# Altium footprint library BWRC.PcbLib: 51 footprints (part 3 of 4)
Each footprint in its own frame and in the unit in brackets; x right, y up, seen from the top. Pads: shape width x height; smd on the part's side, far side on the other; paste and mask are expansions set on the pad; w line width, h text height; cw(c..) or ccw(c..) is an arc to the next point about the centre after c.
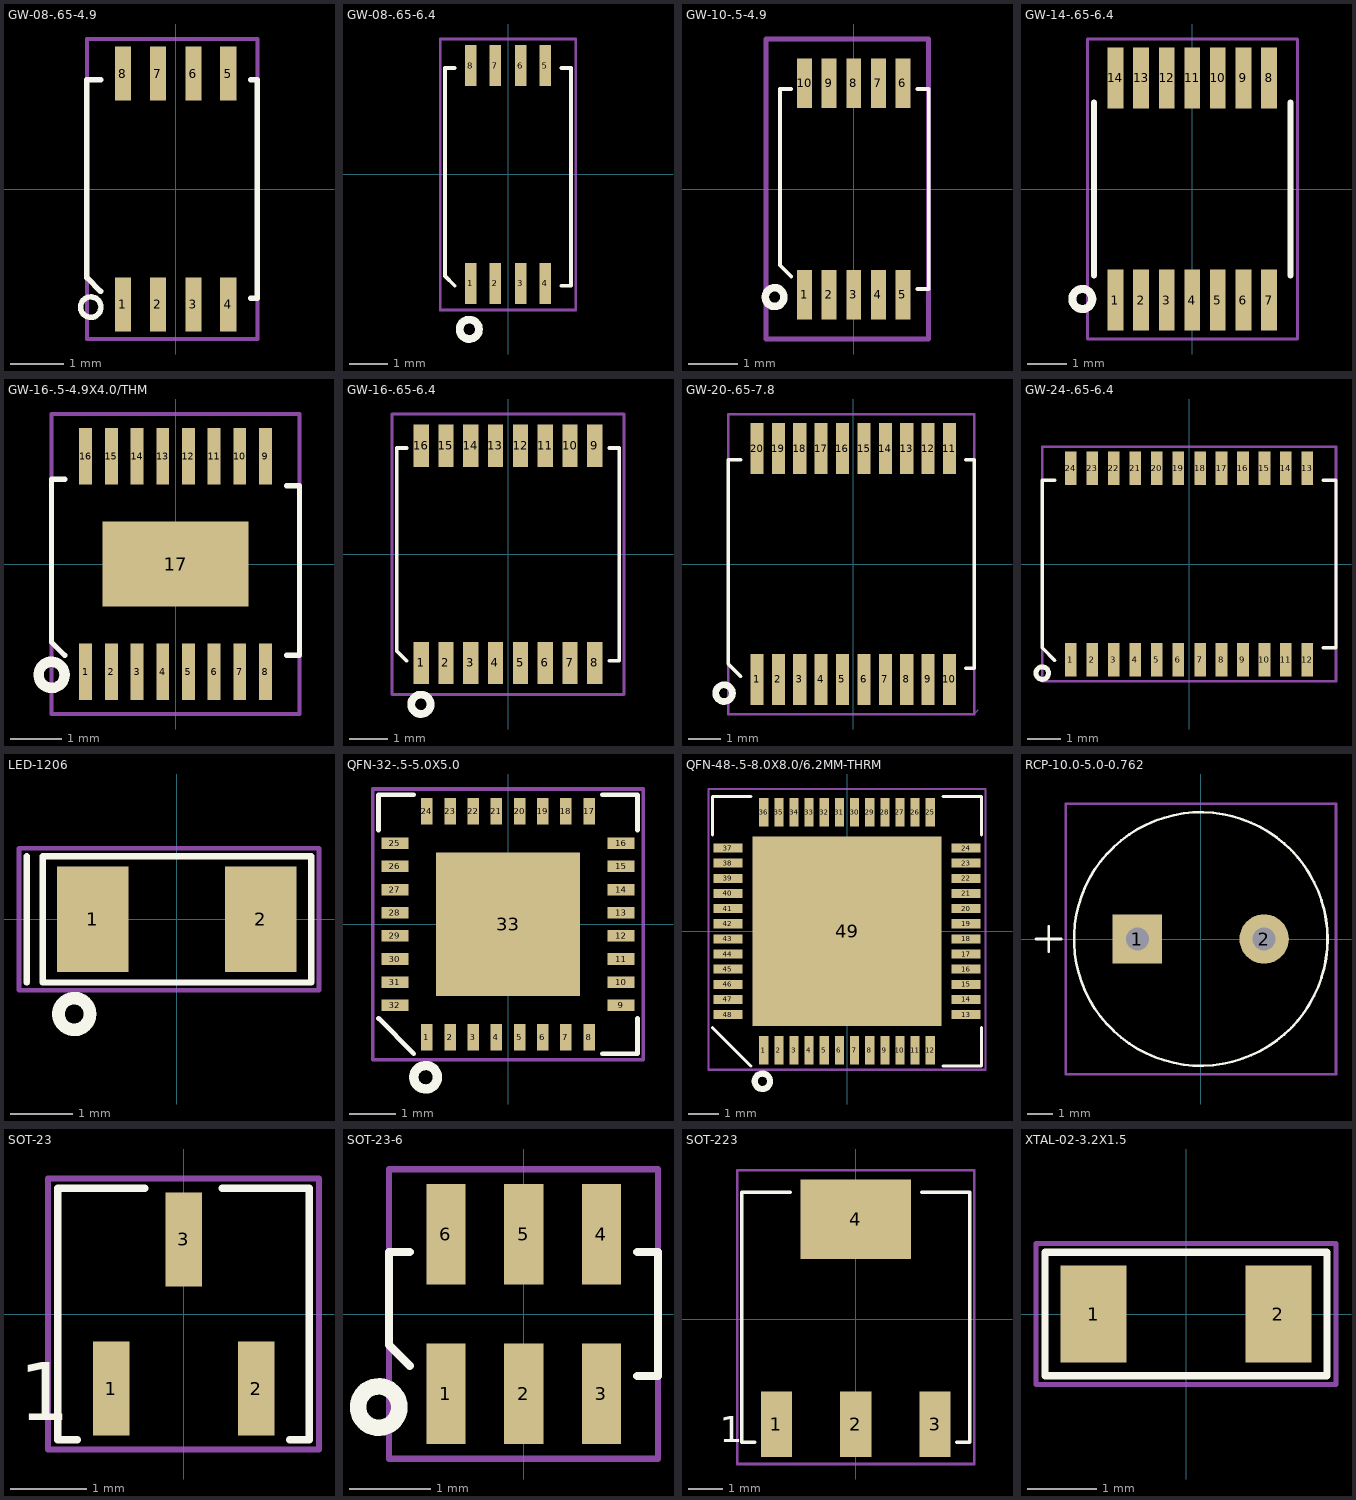
[diagram p2: the footprints below, top view; thin cyan lines are the x and y axes]

## GW-08-.65-4.9 [mm]
pads (8):
  rect 0.3x1.01 smd: 1(-0.98,-2.15) 2(-0.33,-2.15) 3(0.33,-2.15) 4(0.98,-2.15) 5(0.98,2.15) 6(0.33,2.15) 7(-0.33,2.15) 8(-0.98,2.15)
Top Overlay:
  circle w0.102: c-1.58,-2.2 r0.19
  lines w0.102: -1.397,-1.905 -1.651,-1.651 -1.651,2.032 -1.397,2.032 ; 1.397,-2.032 1.524,-2.032 1.524,2.032 1.397,2.032
M15_Courtyard_Top:
  lines w0.076: -1.651,-2.794 -1.651,2.794 1.524,2.794 1.524,-2.794 -1.651,-2.794

## GW-08-.65-6.4 [mm]
pads (8):
  rect 0.3x1.08 smd: 1(-0.98,-2.86) 2(-0.33,-2.86) 3(0.33,-2.86) 4(0.98,-2.86) 5(0.98,2.86) 6(0.33,2.86) 7(-0.33,2.86) 8(-0.98,2.86)
Top Overlay:
  circle w0.203: c-1.016,-4.064 r0.254
  lines w0.102: -1.397,-2.921 -1.651,-2.667 -1.651,2.794 -1.397,2.794 ; 1.397,-2.921 1.651,-2.921 1.651,2.794 1.397,2.794
M15_Courtyard_Top:
  lines w0.076: -1.778,-3.556 1.778,-3.556 1.778,3.556 -1.778,3.556 -1.778,-3.556

## GW-10-.5-4.9 [mm]
pads (10):
  rect 0.304x1.008 smd: 1(-1,-2.146) 2(-0.5,-2.146) 3(0,-2.146) 4(0.5,-2.146) 5(1,-2.146) 6(1,2.146) 7(0.5,2.146) 8(0,2.146) 9(-0.5,2.146) 10(-1,2.146)
Top Overlay:
  circle w0.152: c-1.608,-2.196 r0.19
  lines w0.076: -1.27,-1.778 -1.5,-1.548 -1.5,-1.5 -1.5,2.032 -1.27,2.032 ; 1.295,-2.032 1.524,-2.032 1.524,2.032 1.295,2.032
M15_Courtyard_Top:
  lines w0.102: -1.778,-3.048 -1.778,3.048 1.524,3.048 1.524,-3.048 -1.778,-3.048

## GW-14-.65-6.4 [mm]
pads (14):
  rect 0.4x1.56 smd: 1(-1.95,-2.82) 2(-1.3,-2.82) 3(-0.65,-2.82) 4(0,-2.82) 5(0.65,-2.82) 6(1.3,-2.82) 7(1.95,-2.82) 8(1.95,2.82) 9(1.3,2.82) 10(0.65,2.82) 11(0,2.82) 12(-0.65,2.82) 13(-1.3,2.82) 14(-1.95,2.82)
Top Overlay:
  circle w0.203: c-2.794,-2.794 r0.254
  lines w0.15: -2.5,-2.2 -2.5,2.2 ; 2.5,-2.2 2.5,2.2
M15_Courtyard_Top:
  lines w0.076: -2.667,-3.81 -2.667,3.81 2.667,3.81 2.667,-3.81 -2.667,-3.81

## GW-16-.5-4.9X4.0/THM [mm]
pads (17):
  rect 0.25x1.1 smd: 1(-1.75,-2.1) 2(-1.25,-2.1) 3(-0.75,-2.1) 4(-0.25,-2.1) 5(0.25,-2.1) 6(0.75,-2.1) 7(1.25,-2.1) 8(1.75,-2.1) 9(1.75,2.1) 10(1.25,2.1) 11(0.75,2.1) 12(0.25,2.1) 13(-0.25,2.1) 14(-0.75,2.1) 15(-1.25,2.1) 16(-1.75,2.1)
  rect 2.85x1.65 smd: 17(0,0)
Top Overlay:
  circle w0.203: c-2.413,-2.159 r0.254
  lines w0.102: -2.159,-1.778 -2.413,-1.524 -2.413,1.651 -2.159,1.651 ; 2.159,-1.778 2.413,-1.778 2.413,1.524 2.159,1.524
M15_Courtyard_Top:
  lines w0.076: -2.413,-2.921 2.413,-2.921 2.413,-1.778 2.413,2.921 -2.413,2.921 -2.413,-2.921

## GW-16-.65-6.4 [mm]
pads (16):
  rect 0.4x1.11 smd: 1(-2.28,-2.85) 2(-1.63,-2.85) 3(-0.98,-2.85) 4(-0.33,-2.85) 5(0.33,-2.85) 6(0.98,-2.85) 7(1.63,-2.85) 8(2.28,-2.85) 9(2.28,2.85) 10(1.63,2.85) 11(0.98,2.85) 12(0.33,2.85) 13(-0.33,2.85) 14(-0.98,2.85) 15(-1.63,2.85) 16(-2.28,2.85)
Top Overlay:
  circle w0.203: c-2.286,-3.937 r0.254
  lines w0.102: -2.667,-2.794 -2.921,-2.54 -2.921,2.794 -2.667,2.794 ; 2.667,-2.794 2.921,-2.794 2.921,2.794 2.667,2.794
M15_Courtyard_Top:
  lines w0.076: -3.048,-3.683 -3.048,3.683 3.048,3.683 3.048,-3.683 -3.048,-3.683

## GW-20-.65-7.8 [mm]
pads (20):
  rect 0.4x1.56 smd: 1(-2.93,-3.52) 2(-2.28,-3.52) 3(-1.63,-3.52) 4(-0.98,-3.52) 5(-0.33,-3.52) 6(0.33,-3.52) 7(0.98,-3.52) 8(1.63,-3.52) 9(2.28,-3.52) 10(2.93,-3.52) 11(2.93,3.52) 12(2.28,3.52) 13(1.63,3.52) 14(0.98,3.52) 15(0.33,3.52) 16(-0.33,3.52) 17(-0.98,3.52) 18(-1.63,3.52) 19(-2.28,3.52) 20(-2.93,3.52)
Top Overlay:
  circle w0.203: c-3.937,-3.937 r0.254
  lines w0.102: -3.429,-3.429 -3.81,-3.048 -3.81,3.175 -3.429,3.175 ; 3.429,-3.175 3.683,-3.175 3.683,3.175 3.429,3.175
M15_Courtyard_Top:
  lines w0: 3.683,-4.572 3.81,-4.445
  lines w0.076: -3.81,-4.572 3.683,-4.572 3.683,4.572 -3.81,4.572 -3.81,-4.572

## GW-24-.65-6.4 [mm]
pads (24):
  rect 0.35x1.01 smd: 1(-3.58,-2.9) 2(-2.93,-2.9) 3(-2.28,-2.9) 4(-1.63,-2.9) 5(-0.98,-2.9) 6(-0.33,-2.9) 7(0.33,-2.9) 8(0.98,-2.9) 9(1.63,-2.9) 10(2.28,-2.9) 11(2.93,-2.9) 12(3.58,-2.9) 13(3.58,2.9) 14(2.93,2.9) 15(2.28,2.9) 16(1.63,2.9) 17(0.98,2.9) 18(0.33,2.9) 19(-0.33,2.9) 20(-0.98,2.9) 21(-1.63,2.9) 22(-2.28,2.9) 23(-2.93,2.9) 24(-3.58,2.9)
Top Overlay:
  circle w0.15: c-4.445,-3.302 r0.19
  lines w0.102: -4.064,-2.921 -4.445,-2.54 -4.445,2.54 -4.064,2.54 ; 4.064,-2.54 4.445,-2.54 4.445,2.54 4.064,2.54
M15_Courtyard_Top:
  lines w0.076: -4.445,-3.556 4.445,-3.556 4.445,3.556 -4.445,3.556 -4.445,-3.556
3D body: height 1.19, standoff 0, extent -3.937,-2.54 3.937,2.54

## LED-1206 [mm]
pads (2):
  rect 1.15x1.7 smd: 1(-1.35,0) 2(1.35,0)
Top Overlay:
  circle w0.203: c-1.651,-1.524 r0.254
  lines w0.102: -2.413,-1.016 -2.413,1.016 ; -2.159,-1.016 2.159,-1.016 2.159,1.016 -2.159,1.016 -2.159,-1.016
M15_Courtyard_Top:
  lines w0.076: -2.54,-1.143 2.286,-1.143 2.286,1.143 -2.54,1.143 -2.54,-1.143

## QFN-32-.5-5.0X5.0 [mm]
pads (33):
  rect 0.25x0.58 smd: 1(-1.75,-2.44) 2(-1.25,-2.44) 3(-0.75,-2.44) 4(-0.25,-2.44) 5(0.25,-2.44) 6(0.75,-2.44) 7(1.25,-2.44) 8(1.75,-2.44) 17(1.75,2.44) 18(1.25,2.44) 19(0.75,2.44) 20(0.25,2.44) 21(-0.25,2.44) 22(-0.75,2.44) 23(-1.25,2.44) 24(-1.75,2.44)
  rect 0.58x0.25 smd: 9(2.44,-1.75) 10(2.44,-1.25) 11(2.44,-0.75) 12(2.44,-0.25) 13(2.44,0.25) 14(2.44,0.75) 15(2.44,1.25) 16(2.44,1.75) 25(-2.44,1.75) 26(-2.44,1.25) 27(-2.44,0.75) 28(-2.44,0.25) 29(-2.44,-0.25) 30(-2.44,-0.75) 31(-2.44,-1.25) 32(-2.44,-1.75)
  rect 3.1x3.1 smd: 33(0,0)
Top Overlay:
  circle w0.203: c-1.778,-3.302 r0.254
  lines w0.102: -2.794,-2.032 -2.032,-2.794 ; -2.794,2.032 -2.794,2.794 -2.032,2.794 ; 2.032,-2.794 2.794,-2.794 2.794,-2.032 ; 2.032,2.794 2.794,2.794 2.794,2.032
M15_Courtyard_Top:
  lines w0.076: -2.921,-2.921 -2.921,2.921 2.921,2.921 2.921,-2.921 -2.921,-2.921

## QFN-48-.5-8.0X8.0/6.2MM-THRM [mm]
pads (49):
  rect 0.3x0.95 smd: 1(-2.75,-3.93) 2(-2.25,-3.93) 3(-1.75,-3.93) 4(-1.25,-3.93) 5(-0.75,-3.93) 6(-0.25,-3.93) 7(0.25,-3.93) 8(0.75,-3.93) 9(1.25,-3.93) 10(1.75,-3.93) 11(2.25,-3.93) 12(2.75,-3.93) 25(2.75,3.93) 26(2.25,3.93) 27(1.75,3.93) 28(1.25,3.93) 29(0.75,3.93) 30(0.25,3.93) 31(-0.25,3.93) 32(-0.75,3.93) 33(-1.25,3.93) 34(-1.75,3.93) 35(-2.25,3.93) 36(-2.75,3.93)
  rect 0.95x0.3 smd: 13(3.93,-2.75) 14(3.93,-2.25) 15(3.93,-1.75) 16(3.93,-1.25) 17(3.93,-0.75) 18(3.93,-0.25) 19(3.93,0.25) 20(3.93,0.75) 21(3.93,1.25) 22(3.93,1.75) 23(3.93,2.25) 24(3.93,2.75) 37(-3.93,2.75) 38(-3.93,2.25) 39(-3.93,1.75) 40(-3.93,1.25) 41(-3.93,0.75) 42(-3.93,0.25) 43(-3.93,-0.25) 44(-3.93,-0.75) 45(-3.93,-1.25) 46(-3.93,-1.75) 47(-3.93,-2.25) 48(-3.93,-2.75)
  rect 6.25x6.25 smd: 49(0,0)
Top Overlay:
  circle w0.203: c-2.794,-4.953 r0.254
  lines w0.102: -4.445,-3.175 -3.175,-4.445 ; -4.445,3.175 -4.445,4.445 -3.175,4.445 ; 3.175,-4.445 4.445,-4.445 4.445,-3.175 ; 3.175,4.445 4.445,4.445 4.445,3.175
M15_Courtyard_Top:
  lines w0.076: -4.572,-4.572 -4.572,4.699 4.572,4.699 4.572,-4.572 -4.572,-4.572

## RCP-10.0-5.0-0.762 [mm]
pads (2):
  rect 1.95x1.95 hole 0.914: 1(-2.5,0)
  round 1.95 hole 0.914: 2(2.5,0)
Top Overlay:
  circle w0.102: c0,0 r5
  lines w0.102: -6.5,0.001 -5.5,0.001 ; -6,-0.5 -6,0.5
M15_Courtyard_Top:
  lines w0.102: -5.334,-5.334 -5.334,5.334 5.334,5.334 5.334,-5.334 -5.334,-5.334

## SOT-23 [mil]
pads (3):
  rect 18.9x48.6 smd: 1(-37.4,-38.5) 2(37.6,-38.5) 3(0.1,38.6)
Top Overlay:
  lines w4: -55,-65 -65,-65 -65,65 -20,65 ; 20,65 65,65 65,-65 55,-65
  text "1" at -85,-55 h30
M15_Courtyard_Top:
  lines w3: -70,-70 70,-70 70,70 -70,70 -70,-70

## SOT-23-6 [mil]
pads (6):
  rect 18.9x48.6 smd: 1(-37.5,-38.5) 2(0.1,-38.5) 3(37.6,-38.5) 4(37.6,38.6) 5(0.1,38.6) 6(-37.5,38.6)
Top Overlay:
  circle w8: c-70,-45 r10
  lines w4: -55,-25 -65,-15 -65,30 -55,30 ; 55,-30 65,-30 65,30 55,30
M15_Courtyard_Top:
  lines w3: -65,-70 65,-70 65,70 -50,70 -65,70 -65,-70

## SOT-223 [mm]
pads (4):
  rect 0.9x1.9 smd: 1(-2.3,-3.04) 2(0,-3.04) 3(2.3,-3.04)
  rect 3.2x2.3 smd: 4(0,2.9)
Top Overlay:
  lines w0.102: -2.921,-3.556 -3.302,-3.556 -3.302,3.683 -1.905,3.683 ; 1.905,3.683 3.302,3.683 3.302,-3.556 2.921,-3.556
  text "1" at -3.937,-3.556 h0.76
M15_Courtyard_Top:
  lines w0.076: -3.429,-4.191 3.429,-4.191 3.429,-2.159 3.429,4.318 -3.429,4.318 -3.429,-4.191

## XTAL-02-3.2X1.5 [mm]
pads (2):
  rect 0.95x1.4 smd: 1(-1.33,0) 2(1.33,0)
Top Overlay:
  lines w0.102: -2.032,-0.889 -2.032,0.889 2.032,0.889 2.032,-0.889 -2.032,-0.889
M15_Courtyard_Top:
  lines w0.076: -2.159,-1.016 -2.159,1.016 2.159,1.016 2.159,-1.016 -2.159,-1.016